# Altium integrated library 兰格封装.IntLib: 1176 symbols (part 1 of 6)
Pins are listed as number, name and electrical type; pins without a type are passive.

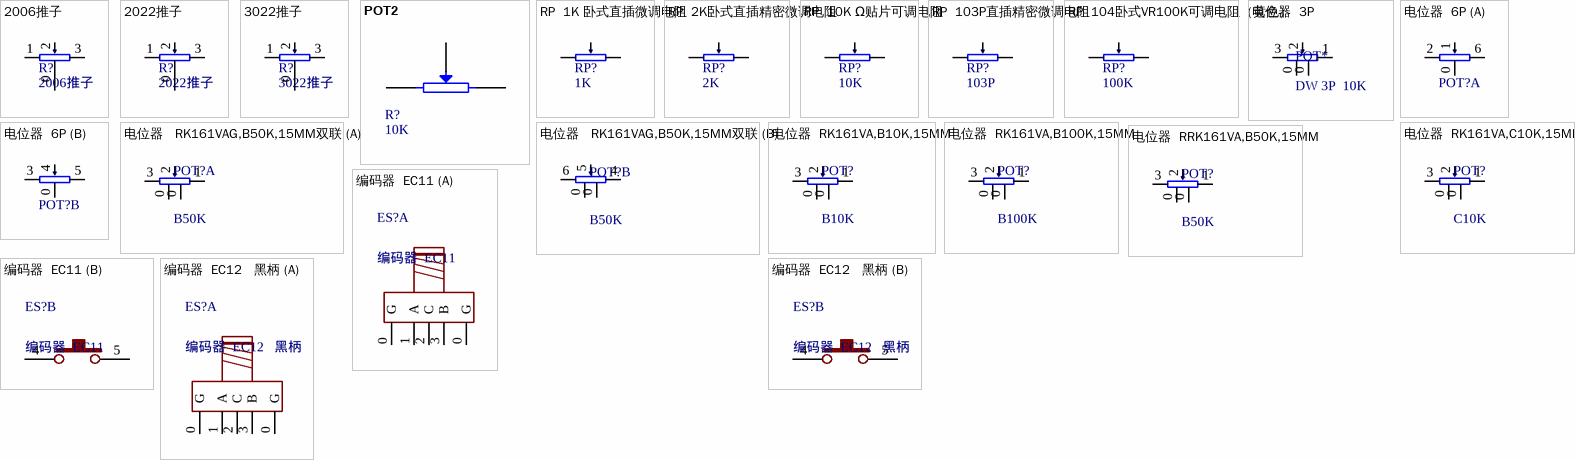
[diagram p0: symbols 2006推子 to 编码器  EC12   黑柄]

## 2006推子
designator R?
SA6005NOA1B-HA1-000推子; 加工方式: 插件; 物料代码: 3.02.06.03.0007; 助记码: SA6005NOA1B-HA1-000T; 单位: ֻ; 备注: MD-2006用; 仓库名称: 五金仓; 物料名称: SA6005NOA1B-HA1-000推子; 规格型号: *
footprint POT  70-60-9-3 (2006推子 脚距70，行程60，宽9，脚数3)
pins: 0, 1, 2, 3

## 2022推子
designator R?
加工方式: 插件; 物料名称: *; 物料代码: *; 助记码: *; 规格型号: *; 单位: *; 仓库名称: *; 备注: *
footprint POT  122-100-10-3 (2022 推子  脚距122，行程100，宽10，脚数3)
pins: 0, 1, 2, 3

## 3022推子
designator R?
加工方式: 插件; 物料名称: *; 物料代码: *; 助记码: *; 规格型号: *; 单位: *; 备注: *; 仓库名称: *
footprint 127-100-16-3 (3022 推子    脚距127，行程100，宽16，脚数3)
footprint POT  127-100-16-3 (3022 推子    脚距127，行程100，宽16，脚数3)
pins: 0, 1, 2, 3

## POT2
designator R?, comment 10K
单位: ֻ; 加工方式: 插件; 物料代码: *; 物料名称: *; 助记码: *; 规格型号: *; 仓库名称: *; 备注: *
footprint 精密电位器
pins: 1, 2, 3 W

## RP  1K 卧式直插微调电阻
designator RP?, comment 1K
1K 卧式直插微调电阻; 物料代码: 3.01.03.02.05.0007; 仓库名称: 元件仓; 助记码: 1K WSZCWDDZ; 单位: ֻ; 加工方式: 插件; 物料名称: 1K 卧式直插微调电阻; 规格型号: *; 备注: *
footprint RP2  1K (1K卧式直插微调电阻)
pins: 1 In, 2 可调, 3 Out

## RP  2K卧式直插精密微调电阻
designator RP?, comment 2K
2K卧式直插精密微调电阻; 物料代码: 3.01.03.02.05.0003; 仓库名称: 元件仓; 助记码: 2KWSZCJMWDDZ; 单位: ֻ; 加工方式: 插件; 物料名称: 2K卧式直插精密微调电阻; 规格型号: *; 备注: *
footprint RP2  2K (2K卧式直插微调电阻)
pins: 1 In, 2 可调, 3 Out

## RP  10K Ω贴片可调电阻
designator RP?, comment 10K
10K Ω贴片可调电阻; 物料代码: 3.01.03.01.04.0001; 仓库名称: 元件仓; 助记码: 10K ΩTPKDDZ; 规格型号: 3*3MM; 单位: ֻ; 加工方式: 贴片; 物料名称: 10K Ω贴片可调电阻; 备注: *
footprint SOT  23
footprint TR 3*3
pins: 1 In, 2 可调, 3 Out

## RP  103P直插精密微调电阻
designator RP?, comment 103P
103P直插精密微调电阻; 物料代码: 3.01.03.02.05.0001; 仓库名称: 元件仓; 助记码: 103PZCJMWDDZ; 单位: ֻ; 加工方式: 插件; 物料名称: 103P直插精密微调电阻; 规格型号: *; 备注: *
pins: 1 In, 2 可调, 3 Out

## RP  104卧式VR100K可调电阻（黄色）
designator RP?, comment 100K
104卧式VR100K可调电阻（黄色）; 物料代码: 3.01.03.02.05.0002; 仓库名称: 元件仓; 单位: ֻ; 加工方式: 插件; 物料名称: 104卧式VR100K可调电阻（黄色）; 助记码: *; 规格型号: *; 备注: *
footprint RP2  100K (100K卧式直插微调电阻)
pins: 1 In, 2 可调, 3 Out

## 电位器  3P
designator POT*, comment DW 3P  10K
RV0932N-F20-C10K电位器; 加工方式: 插件; 物料代码: 3.02.06.02.0007; 助记码: RV0932N-F20-C10KDWQ; 仓库名称: 五金仓; 单位: ֻ; 备注: MD-2006用; 规格型号: 玻纤板亮锡; 物料名称: RV0932N-F20-C10K电位器
footprint POT  10*11.5*23.5 (电位器)
pins: 0, 0, 1, 2, 3

## 电位器  6P
designator POT?, comment DW  6P  50K  (value not drawn)
11KGH-5 B50K L20F*7电位器; 加工方式: 插件; 物料代码: 3.02.06.02.0006; 助记码: 11KGH-5 B50K L20F*7D; 规格型号: 六脚; 单位: ֻ; 备注: MD-2006用; 仓库名称: 五金仓; 物料名称: 11KGH-5 B50K L20F*7电位器
footprint POT  13*16*22.5 G (电位器  2006用)
part A pins: 0, 1, 2, 6
part B pins: 0, 3, 4, 5

## 电位器   RK161VAG,B50K,15MM双联
designator POT?, comment B50K
RK161VAG,B50K,15MM双联电位器; 单位: ֻ; 物料代码: 3.02.06.01.0015; 助记码: RK161VAG,B50K,15MMSLDWQ; 仓库名称: 五金仓·; 物料名称: RK161VAG,B50K,15MM双联电位器
footprint RK161VAG B50K 15MM 双联电位器 (POT RK161VAG B50K 15MM 双联电位器)
part A pins: 0, 0, 1, 2, 3
part B pins: 0, 0, 4, 5, 6

## 电位器  RK161VA,B10K,15MM
designator POT?, comment B10K
RK161VA,B10K,15MM电位器; 单位: ֻ; 物料代码: 3.02.06.01.0010; 仓库名称: 五金仓; 加工方式: 插件; 物料名称: RK161VA,B10K,15MM电位器
footprint RK161VA B10K 15MM (POT RK161VA B10K 15MM)
pins: 0, 0, 1, 2, 3

## 电位器  RK161VA,B100K,15MM
designator POT?, comment B100K
RK161VA,B100K,15MM电位器; 单位: ֻ; 物料代码: 3.02.06.01.0012; 仓库名称: 五金仓; 加工方式: 插件; 物料名称: RK161VA,B100K,15MM电位器
footprint RK161VA B100K 15MM (POT RK161VA B100K 15MM)
pins: 0, 0, 1, 2, 3

## 电位器  RK161VA,C10K,15MM 
designator POT?, comment C10K
RK161VA,C10K,15MM 电位器; 单位: ֻ; 物料代码: 3.02.06.01.0013; 仓库名称: 五金仓; 加工方式: 插件; 物料名称: RK161VA,C10K,15MM 电位器
footprint RK161VA B10K 15MM (POT RK161VA B10K 15MM)
pins: 0, 0, 1, 2, 3

## 电位器  RRK161VA,B50K,15MM
designator POT?, comment B50K
RK161VA,B50K,15MM电位器; 单位: ֻ; 物料代码: 3.02.06.01.0011; 助记码: RK161VA,B50K,15MMDWQ; 仓库名称: 五金仓; 加工方式: 插件; 物料名称: RK161VA,B50K,15MM电位器
footprint RK161VA B50K 15MM (POT RK161VA B50K 15MM)
pins: 0, 0, 1, 2, 3

## 编码器  EC11
designator ES?
EC1102NS-G5-Y15/7-20P2-004编码器; 加工方式: 插件; 物料代码: 3.02.07.05.0005; 单位: ֻ; 备注: K-5200/5210/MD-2006用; 仓库名称: 五金仓; 物料名称: EC1102NS-G5-Y15/7-20P2-004编码器; 助记码: EC1102NS-G5-Y15/7-20; 规格型号: *
footprint EC11
part A pins: 0 G, 0 G, 1 A, 2 C, 3 B
part B pins: 4 SW, 5 SW

## 编码器  EC12   黑柄
designator ES?
EC1202S-D4-F25/7-24P24C编码器; 加工方式: 插件; 物料代码: 3.02.07.05.0006; 规格型号: 黑色塑柄; 单位: ֻ; 备注: T-1500/A-808用; 仓库名称: 五金仓; 物料名称: EC1202S-D4-F25/7-24P24C编码器; 助记码: EC1202S-D4-F25/7-24P
footprint EC12 (黑柄)
part A pins: 0 G, 0 G, 1 A, 2 C, 3 B
part B pins: 4 SW, 5 SW


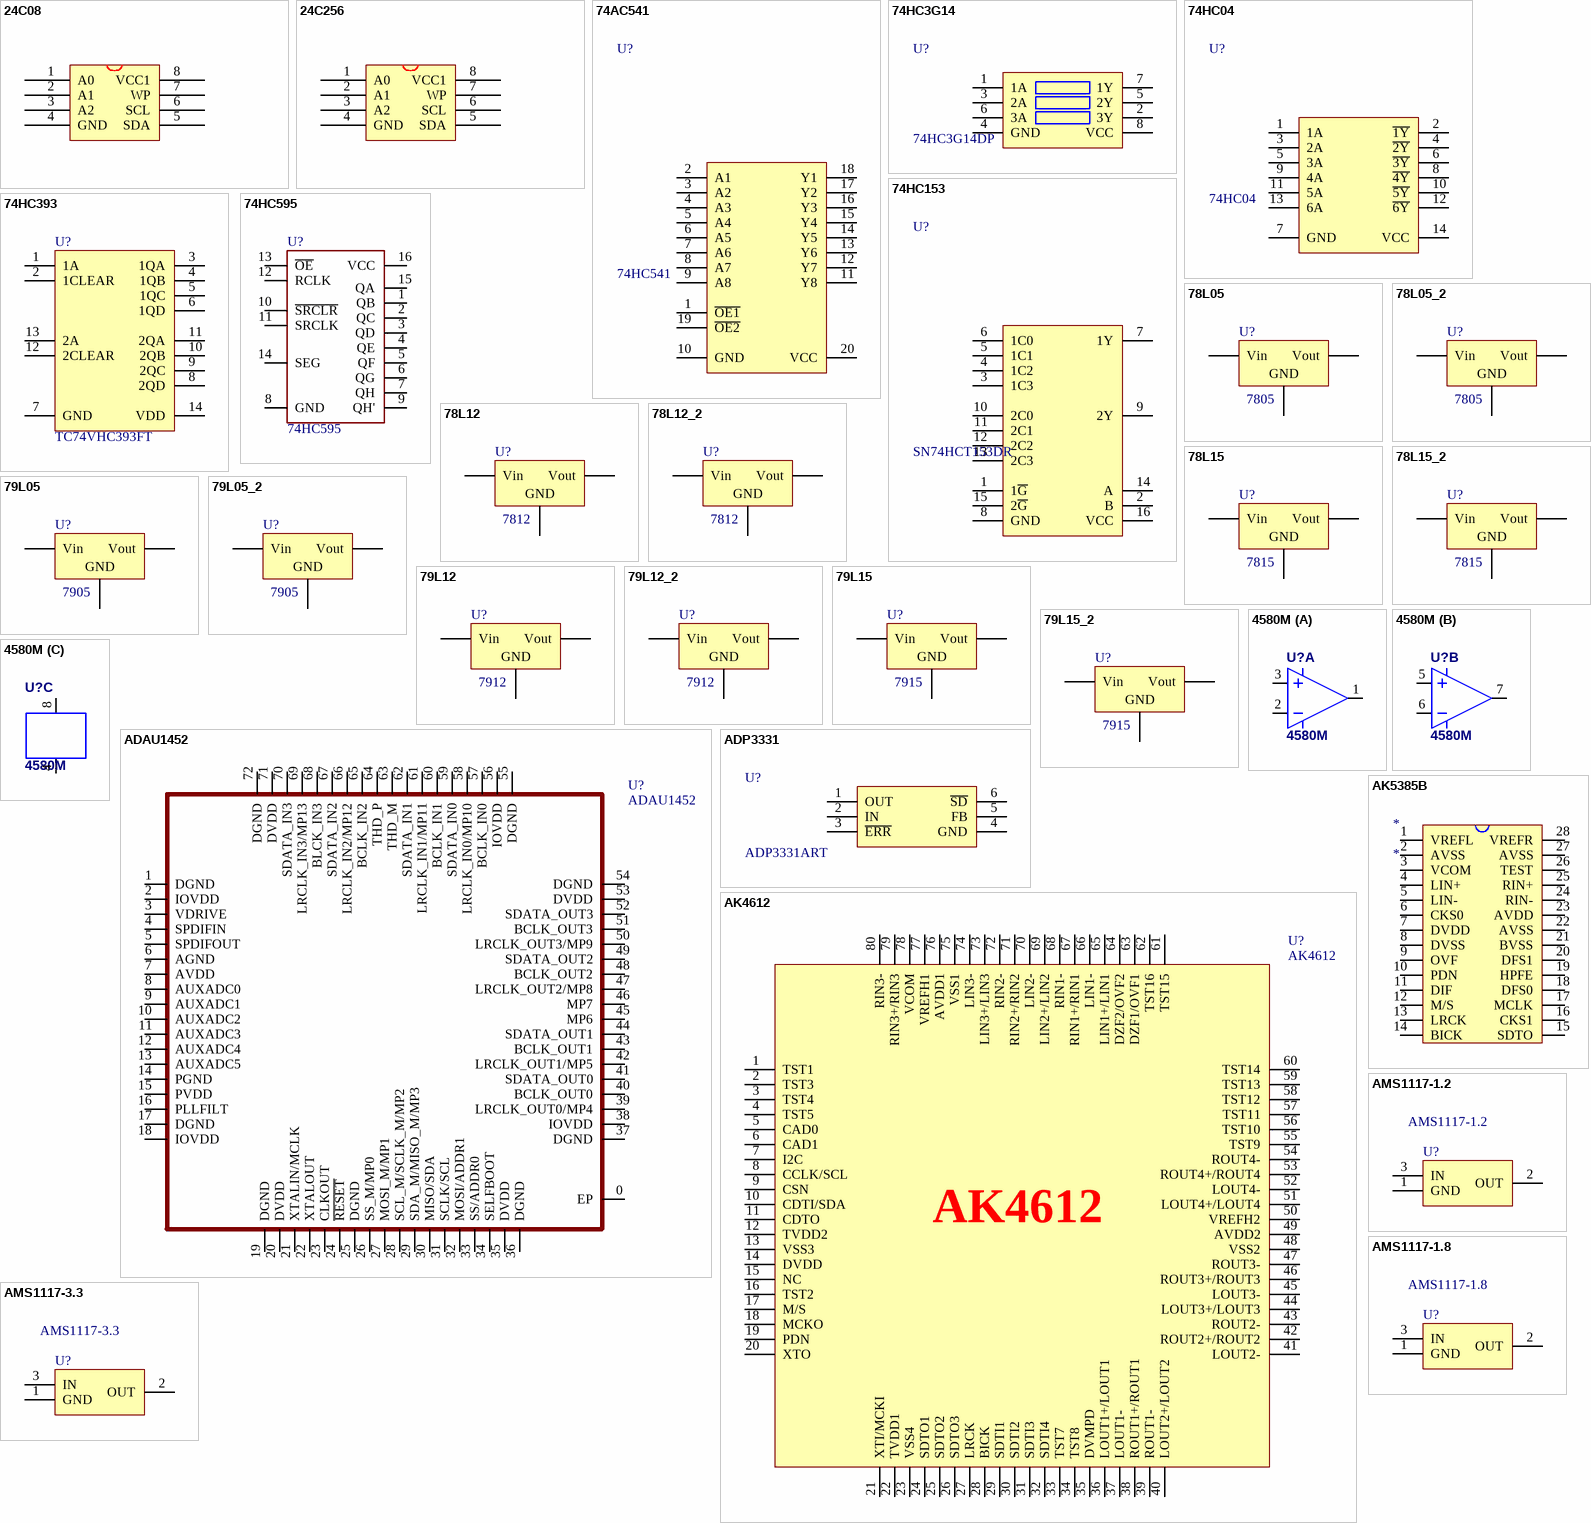
[diagram p1: symbols 24C08 to AMS1117-3.3]

## 24C08
designator U?
HK24C08贴片IC; 物料代码: 3.01.04.02.0079; 助记码: HK24C08TPIC; 规格型号: SOP8; 仓库名称: 元件仓; 单位: ֻ; 加工方式: 贴片; 物料名称: HK24C08贴片IC; 备注: *
footprint SOP 8
pins: 1 A0, 2 A1, 3 A2, 4 GND, 5 SDA, 6 SCL, 7 WP, 8 VCC1

## 24C256
designator U?, comment 24C04
仓库名称: 元件仓; 单位: ֻ; 加工方式: 贴片; 物料代码: *; 物料名称: *; 助记码: *; 规格型号: *; 备注: *
footprint SOP 8
pins: 1 A0, 2 A1, 3 A2, 4 GND, 5 SDA, 6 SCL, 7 WP, 8 VCC1
1 alternate drawing of the same symbol

## 74AC541
designator U?, comment 74HC541
74HC541D贴片IC; 物料代码: 3.01.04.02.0051; 助记码: 74HC541DTPIC; 规格型号: SOP-20; 单位: ֻ; 仓库名称: 元件仓; 物料名称: 74HC541D贴片IC; 加工方式: *
footprint TSSOP 20
pins: 1 ~{OE1} (power), 2 A1, 3 A2, 4 A3, 5 A4, 6 A5, 7 A6, 8 A7, 9 A8, 10 GND, 11 Y8, 12 Y7, 13 Y6, 14 Y5, 15 Y4, 16 Y3, 17 Y2, 18 Y1, 19 ~{OE2} (power), 20 VCC

## 74HC3G14
designator U?, comment 74HC3G14DP
74HC3G14DP 贴片IC; 物料代码: 3.01.04.02.0024; 助记码: 74HC3G14DP TPIC; 规格型号: TSSOP-8; 仓库名称: 元件仓; 单位: ֻ; 物料名称: 74HC3G14DP 贴片IC; 备注: *; 加工方式: *
footprint TSSOP 8
pins: 1 1A, 2 3Y, 3 2A, 4 GND, 5 2Y, 6 3A, 7 1Y (hiz), 8 VCC

## 74HC04
designator U?
74HC04D 贴片IC; 物料代码: 3.01.04.02.0020; 规格型号: SOP-14; 助记码: 74HC04D TPIC; 单位: ֻ; 仓库名称: 元件仓; 物料名称: 74HC04D 贴片IC; 备注: *; 加工方式: *
footprint SOP 14
pins: 1 1A, 2 ~{1Y}, 3 2A, 4 ~{2Y}, 5 3A, 6 ~{3Y}, 7 GND, 8 ~{4Y}, 9 4A, 10 ~{5Y}, 11 5A, 12 ~{6Y}, 13 6A, 14 VCC
2 alternate drawings of the same symbol

## 74HC153
designator U?, comment SN74HCT153DR
74HC153D 贴片IC; 物料代码: 3.01.04.02.0021; 助记码: 74HC153D TPIC; 规格型号: SOP-16; 单位: ֻ; 仓库名称: 元件仓; 物料名称: 74HC153D 贴片IC; 加工方式: *
footprint SOP 16
pins: 1 1~{G}, 2 B, 3 1C3, 4 1C2, 5 1C1, 6 1C0, 7 1Y, 8 GND, 9 2Y, 10 2C0, 11 2C1, 12 2C2, 13 2C3, 14 A, 15 2~{G}, 16 VCC

## 74HC393
designator U?, comment TC74VHC393FT
TC74VHC393FT 贴片IC; 加工方式: 贴片; 物料代码: 3.01.04.02.0023; 助记码: TSSOP-14; 规格型号: TC74VHC393FT TPIC; 单位: ֻ; 仓库名称: 元件仓; 物料名称: TC74VHC393FT 贴片IC; 备注: *
footprint TSSOP 14
pins: 1 1A, 2 1CLEAR, 3 1QA, 4 1QB, 5 1QC, 6 1QD, 7 GND (power), 8 2QD, 9 2QC, 10 2QB, 11 2QA, 12 2CLEAR, 13 2A, 14 VDD (power)

## 74HC595
designator U?
单位: ֻ; 仓库名称: 元件仓; 加工方式: 贴片; 物料代码: *; 物料名称: *; 助记码: *; 规格型号: *; 备注: *
footprint SOP 16
pins: 1 QB, 2 QC, 3 QD, 4 QE, 5 QF, 6 QG, 7 QH, 8 GND, 9 QH', 10 ~{SRCLR}, 11 SRCLK, 12 RCLK, 13 ~{OE}, 14 SEG, 15 QA, 16 VCC

## 78L05
designator U?, comment 7805
L7805直插稳压管; 物料代码: 3.01.16.01.0006; 助记码: L7805ZCWYG; 仓库名称: 元件仓; 单位: 个; 规格型号: TO-220; 加工方式: 插件; 物料名称: L7805直插稳压管
footprint TO 220
pins: 1 Vin, 2 GND, 3 Vout

## 78L05_2
designator U?, comment 7805
L7805直插稳压管（带散热架）; 物料代码: 3.01.16.01.0006; 助记码: L7805ZCWYG; 仓库名称: 元件仓; 单位: 个; 规格型号: TO-220; 备注: （带散热架）; 加工方式: 插件; 物料名称: L7805直插稳压管
footprint TO 220_2 (带散热架)
pins: 1 Vin, 2 GND, 3 Vout

## 78L12
designator U?, comment 7812
L7812CV直插稳压管; 物料代码: 3.01.16.01.0005; 仓库名称: 元件仓; 单位: ֻ; 规格型号: TO-220; 加工方式: 插件; 物料名称: L7812CV直插稳压管; 助记码: *; 备注: *
footprint TO 220
pins: 1 Vin, 2 GND, 3 Vout

## 78L12_2
designator U?, comment 7812
L7812CV直插稳压管（带散热架）; 物料代码: 3.01.16.01.0005; 仓库名称: 元件仓; 单位: ֻ; 规格型号: TO-220; 备注: （带散热架）; 加工方式: 插件; 物料名称: L7812CV直插稳压管; 助记码: *
footprint TO 220
pins: 1 Vin, 2 GND, 3 Vout

## 78L15
designator U?, comment 7815
KA7815直插稳压管; 物料代码: 3.01.16.01.0001; 助记码: KA7815ZCWYG; 仓库名称: 元件仓; 单位: ֻ; 规格型号: TO-220; 加工方式: 插件; 物料名称: KA7815直插稳压管; 备注: *
footprint TO 220
pins: 1 Vin, 2 GND, 3 Vout

## 78L15_2
designator U?, comment 7815
KA7815直插稳压管（带散热架）; 物料代码: 3.01.16.01.0001; 助记码: KA7815ZCWYG; 仓库名称: 元件仓; 单位: ֻ; 规格型号: TO-220; 备注: （带散热架）; 加工方式: 插件; 物料名称: KA7815直插稳压管
footprint TO 220
pins: 1 Vin, 2 GND, 3 Vout

## 79L05
designator U?, comment 7905
L7905CV直插稳压管; 物料代码: 3.01.16.01.0002; 仓库名称: 元件仓; 单位: ֻ; 规格型号: TO-220; 加工方式: 插件; 物料名称: L7905CV直插稳压管
footprint TO 220
pins: 1 GND, 2 Vin, 3 Vout

## 79L05_2
designator U?, comment 7905
L7905CV直插稳压管（带散热架）; 物料代码: 3.01.16.01.0002; 仓库名称: 元件仓; 单位: ֻ; 规格型号: TO-220; 备注: （带散热架）; 加工方式: 插件; 物料名称: L7905CV直插稳压管
footprint TO 220
pins: 1 GND, 2 Vin, 3 Vout

## 79L12
designator U?, comment 7912
L7912CV直插稳压管; 物料代码: 3.01.16.01.0004; 仓库名称: 元件仓; 单位: ֻ; 规格型号: TO-220; 加工方式: 插件; 物料名称: L7912CV直插稳压管; 助记码: *; 备注: *
footprint TO 220
pins: 1 GND, 2 Vin, 3 Vout

## 79L12_2
designator U?, comment 7912
L7912CV直插稳压管（带散热架）; 物料代码: 3.01.16.01.0004; 仓库名称: 元件仓; 单位: ֻ; 规格型号: TO-220; 备注: （带散热架）; 加工方式: 插件; 物料名称: L7912CV直插稳压管; 助记码: *
footprint TO 220
pins: 1 GND, 2 Vin, 3 Vout

## 79L15
designator U?, comment 7915
KA7915直插稳压管; 物料代码: 3.01.16.01.0009; 助记码: KA7915ZCWYG; 仓库名称: 元件仓; 单位: ֻ; 规格型号: TO-220; 加工方式: 插件; 物料名称: KA7915直插稳压管; 备注: *
footprint TO 220
pins: 1 GND, 2 Vin, 3 Vout

## 79L15_2
designator U?, comment 7915
KA7915直插稳压管（带散热架）; 物料代码: 3.01.16.01.0009; 助记码: KA7915ZCWYG; 仓库名称: 元件仓; 单位: ֻ; 规格型号: TO-220; 备注: （带散热架）; 加工方式: 插件; 物料名称: KA7915直插稳压管
footprint TO 220
pins: 1 GND, 2 Vin, 3 Vout

## 4580M
designator U?
SRT4580SM TRPBF贴片IC 运算放大器; 物料代码: 3.01.04.02.0065; 助记码: SRT4580SM TRPBFTPIC; 规格型号: SOP8; 仓库名称: 元件仓; 单位: ֻ; 加工方式: 贴片; 物料名称: SRT4580SM TRPBF贴片IC 运算放大器; 备注: *
footprint SOP 8
part A pins: 1, 2, 3
part B pins: 5, 6, 7
part C pins: 4, 8

## ADAU1452
designator U?
物料名称: *; 加工方式: *; 物料代码: *; 助记码: *; 规格型号: *; 单位: *; 备注: *; 仓库名称: *
footprint LFCSP 72 - duplicate
pins: 0 EP, 1 DGND, 2 IOVDD, 3 VDRIVE, 4 SPDIFIN, 5 SPDIFOUT, 6 AGND, 7 AVDD, 8 AUXADC0, 9 AUXADC1, 10 AUXADC2, 11 AUXADC3, 12 AUXADC4, 13 AUXADC5, 14 PGND, 15 PVDD, 16 PLLFILT, 17 DGND, 18 IOVDD, 19 DGND, 20 DVDD, 21 XTALIN/MCLK, 22 XTALOUT, 23 CLKOUT, 24 ~{RESET}, 25 DGND, 26 SS_M/MP0, 27 MOSI_M/MP1, 28 SCL_M/SCLK_M/MP2, 29 SDA_M/MISO_M/MP3, 30 MISO/SDA, 31 SCLK/SCL, 32 MOSI/ADDR1, 33 SS/ADDR0, 34 SELFBOOT, 35 DVDD, 36 DGND, 37 DGND, 38 IOVDD, 39 LRCLK_OUT0/MP4, 40 BCLK_OUT0, 41 SDATA_OUT0, 42 LRCLK_OUT1/MP5, 43 BCLK_OUT1, 44 SDATA_OUT1, 45 MP6, 46 MP7, 47 LRCLK_OUT2/MP8, 48 BCLK_OUT2, 49 SDATA_OUT2, 50 LRCLK_OUT3/MP9, 51 BCLK_OUT3, 52 SDATA_OUT3, 53 DVDD, 54 DGND, 55 DGND, 56 IOVDD, 57 BCLK_IN0, 58 LRCLK_IN0/MP10, 59 SDATA_IN0, 60 BCLK_IN1, 61 LRCLK_IN1/MP11, 62 SDATA_IN1, 63 THD_M, 64 THD_P, 65 BCLK_IN2, 66 LRCLK_IN2/MP12, 67 SDATA_IN2, 68 BLCK_IN3, 69 LRCLK_IN3/MP13, 70 SDATA_IN3, 71 DVDD, 72 DGND

## ADP3331
designator U?, comment ADP3331ART
高精度、超低静态电流LDO; 仓库名称: 元件仓; 单位: ֻ; 加工方式: 贴片; 物料代码: *; 物料名称: *; 助记码: *; 规格型号: *; 备注: *
footprint SOT 23-6
pins: 1 OUT, 2 IN, 3 ~{ERR}, 4 GND, 5 FB, 6 ~{SD}

## AK4612
designator U?
AK4612-EQ贴片IC; 物料代码: 3.01.04.02.0063; 规格型号: LQFP80; 助记码: AK4612-EQTPIC; 单位: ֻ; 仓库名称: 元件仓; 加工方式: 贴片; 物料名称: AK4612-EQ贴片IC
footprint LQFP  80
pins: 1 TST1, 2 TST3, 3 TST4, 4 TST5, 5 CAD0, 6 CAD1, 7 I2C, 8 CCLK/SCL, 9 CSN, 10 CDTI/SDA, 11 CDTO, 12 TVDD2, 13 VSS3, 14 DVDD, 15 NC, 16 TST2, 17 M/S, 18 MCKO, 19 PDN, 20 XTO, 21 XTI/MCKI, 22 TVDD1, 23 VSS4, 24 SDTO1, 25 SDTO2, 26 SDTO3, 27 LRCK, 28 BICK, 29 SDTI1, 30 SDTI2, 31 SDTI3, 32 SDTI4, 33 TST7, 34 TST8, 35 DVMPD, 36 LOUT1+/LOUT1, 37 LOUT1-, 38 ROUT1+/ROUT1, 39 ROUT1-, 40 LOUT2+/LOUT2, 41 LOUT2-, 42 ROUT2+/ROUT2, 43 ROUT2-, 44 LOUT3+/LOUT3, 45 LOUT3-, 46 ROUT3+/ROUT3, 47 ROUT3-, 48 VSS2, 49 AVDD2, 50 VREFH2, 51 LOUT4+/LOUT4, 52 LOUT4-, 53 ROUT4+/ROUT4, 54 ROUT4-, 55 TST9, 56 TST10, 57 TST11, 58 TST12, 59 TST13, 60 TST14, 61 TST15, 62 TST16, 63 DZF1/OVF1, 64 DZF2/OVF2, 65 LIN1+/LIN1, 66 LIN1-, 67 RIN1+/RIN1, 68 RIN1-, 69 LIN2+/LIN2, 70 LIN2-, 71 RIN2+/RIN2, 72 RIN2-, 73 LIN3+/LIN3, 74 LIN3-, 75 VSS1, 76 AVDD1, 77 VREFH1, 78 VCOM, 79 RIN3+/RIN3, 80 RIN3-

## AK5385B
designator *
物料名称: *; 助记码: *; 规格型号: *; 仓库名称: *; 单位: *; 备注: *; 加工方式: *
footprint VSOP 28
pins: 1 VREFL, 2 AVSS, 3 VCOM, 4 LIN+, 5 LIN-, 6 CKS0, 7 DVDD, 8 DVSS, 9 OVF, 10 PDN, 11 DIF, 12 M/S, 13 LRCK, 14 BICK, 15 SDTO, 16 CKS1, 17 MCLK, 18 DFS0, 19 HPFE, 20 DFS1, 21 BVSS, 22 AVSS, 23 AVDD, 24 RIN-, 25 RIN+, 26 TEST, 27 AVSS, 28 VREFR

## AMS1117-1.2
designator U?
AMS1117-3.3 贴片稳压IC; 物料名称: AMS1117-1.2 贴片稳压IC; 仓库名称: 元件仓; 规格型号: ASM1117-1.2   1551TP; 单位: ֻ; 加工方式: 贴片; 备注: *
footprint SOT-223-4PIN (电源降压  5V降至3.3V)
pins: 1 GND, 2 OUT, 3 IN

## AMS1117-1.8
designator U?
AMS1117-1.8 贴片稳压IC; 仓库名称: 元件仓; 规格型号: ASM1117-1.8   1551TP; 单位: ֻ; 加工方式: 贴片; 物料名称: AMS1117-1.8 贴片稳压IC; 备注: *
footprint SOT-223-4PIN (电源降压  5V降至3.3V)
pins: 1 GND, 2 OUT, 3 IN

## AMS1117-3.3
designator U?
AMS1117-3.3 贴片稳压IC; 物料代码: 3.01.04.02.0004; 仓库名称: 元件仓; 助记码: SOT-223; 规格型号: ASM1117-3.3   1551TP; 单位: ֻ; 加工方式: 贴片; 物料名称: AMS1117-3.3 贴片稳压IC; 备注: *
footprint SOT 223
pins: 1 GND, 2 OUT, 3 IN

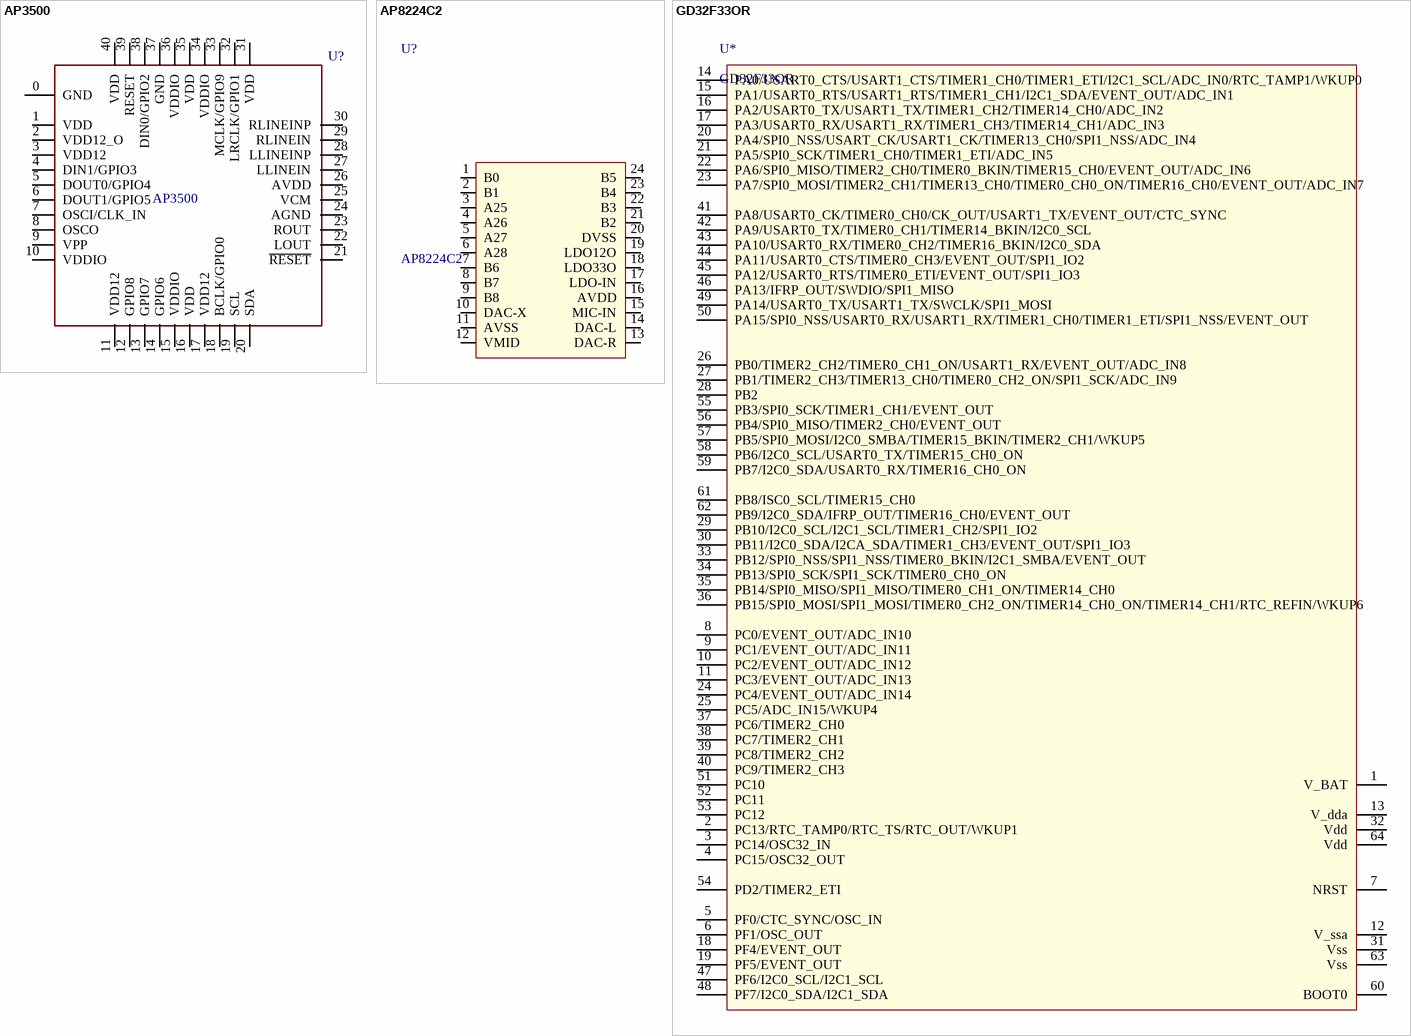
[diagram p2: symbols AP3500 to GD32F33OR]

## AP3500
designator U?
仓库名称: 元件仓; 单位: ֻ; 加工方式: 贴片; 物料代码: *; 物料名称: *; 助记码: *; 规格型号: *; 备注: *
footprint QFN40 (AP3500   5*5MM)
pins: 0 GND, 1 VDD, 2 VDD12_O, 3 VDD12, 4 DIN1/GPIO3, 5 DOUT0/GPIO4, 6 DOUT1/GPIO5, 7 OSCI/CLK_IN, 8 OSCO, 9 VPP, 10 VDDIO, 11 VDD12, 12 GPIO8, 13 GPIO7, 14 GPIO6, 15 VDDIO, 16 VDD, 17 VDD12, 18 BCLK/GPIO0, 19 SCL, 20 SDA, 21 ~{RESET}, 22 LOUT, 23 ROUT, 24 AGND, 25 VCM, 26 AVDD, 27 LLINEIN, 28 LLINEINP, 29 RLINEIN, 30 RLINEINP, 31 VDD, 32 LRCLK/GPIO1, 33 MCLK/GPIO9, 34 VDDIO, 35 VDD, 36 VDDIO, 37 GND, 38 DIN0/GPIO2, 39 RESET, 40 VDD

## AP8224C2
designator U?
（无）AP8224C2; 仓库名称: 元件仓; 单位: ֻ; 加工方式: 贴片; 物料代码: *; 物料名称: *; 助记码: *; 备注: *; 规格型号: *
footprint TSSOP 24
pins: 1 B0, 2 B1, 3 A25, 4 A26, 5 A27, 6 A28, 7 B6, 8 B7, 9 B8, 10 DAC-X, 11 AVSS, 12 VMID, 13 DAC-R, 14 DAC-L, 15 MIC-IN, 16 AVDD, 17 LDO-IN, 18 LDO33O, 19 LDO12O, 20 DVSS, 21 B2, 22 B3, 23 B4, 24 B5

## GD32F33OR
designator U*
LQFP64; 单位: ֻ; 仓库名称: 元件仓; 加工方式: 贴片; 物料名称: GD32F33OR; 物料代码: *; 规格型号: *; 助记码: *; 备注: *
footprint LQFP  64
pins: 1 V_BAT, 2 PC13/RTC_TAMP0/RTC_TS/RTC_OUT/WKUP1, 3 PC14/OSC32_IN, 4 PC15/OSC32_OUT, 5 PF0/CTC_SYNC/OSC_IN, 6 PF1/OSC_OUT, 7 NRST, 8 PC0/EVENT_OUT/ADC_IN10, 9 PC1/EVENT_OUT/ADC_IN11, 10 PC2/EVENT_OUT/ADC_IN12, 11 PC3/EVENT_OUT/ADC_IN13, 12 V_ssa, 13 V_dda, 14 PA0/USART0_CTS/USART1_CTS/TIMER1_CH0/TIMER1_ETI/I2C1_SCL/ADC_IN0/RTC_TAMP1/WKUP0, 15 PA1/USART0_RTS/USART1_RTS/TIMER1_CH1/I2C1_SDA/EVENT_OUT/ADC_IN1, 16 PA2/USART0_TX/USART1_TX/TIMER1_CH2/TIMER14_CH0/ADC_IN2, 17 PA3/USART0_RX/USART1_RX/TIMER1_CH3/TIMER14_CH1/ADC_IN3, 18 PF4/EVENT_OUT, 19 PF5/EVENT_OUT, 20 PA4/SPI0_NSS/USART_CK/USART1_CK/TIMER13_CH0/SPI1_NSS/ADC_IN4, 21 PA5/SPI0_SCK/TIMER1_CH0/TIMER1_ETI/ADC_IN5, 22 PA6/SPI0_MISO/TIMER2_CH0/TIMER0_BKIN/TIMER15_CH0/EVENT_OUT/ADC_IN6, 23 PA7/SPI0_MOSI/TIMER2_CH1/TIMER13_CH0/TIMER0_CH0_ON/TIMER16_CH0/EVENT_OUT/ADC_IN7, 24 PC4/EVENT_OUT/ADC_IN14, 25 PC5/ADC_IN15/WKUP4, 26 PB0/TIMER2_CH2/TIMER0_CH1_ON/USART1_RX/EVENT_OUT/ADC_IN8, 27 PB1/TIMER2_CH3/TIMER13_CH0/TIMER0_CH2_ON/SPI1_SCK/ADC_IN9, 28 PB2, 29 PB10/I2C0_SCL/I2C1_SCL/TIMER1_CH2/SPI1_IO2, 30 PB11/I2C0_SDA/I2CA_SDA/TIMER1_CH3/EVENT_OUT/SPI1_IO3, 31 Vss, 32 Vdd, 33 PB12/SPI0_NSS/SPI1_NSS/TIMER0_BKIN/I2C1_SMBA/EVENT_OUT, 34 PB13/SPI0_SCK/SPI1_SCK/TIMER0_CH0_ON, 35 PB14/SPI0_MISO/SPI1_MISO/TIMER0_CH1_ON/TIMER14_CH0, 36 PB15/SPI0_MOSI/SPI1_MOSI/TIMER0_CH2_ON/TIMER14_CH0_ON/TIMER14_CH1/RTC_REFIN/WKUP6, 37 PC6/TIMER2_CH0, 38 PC7/TIMER2_CH1, 39 PC8/TIMER2_CH2, 40 PC9/TIMER2_CH3, 41 PA8/USART0_CK/TIMER0_CH0/CK_OUT/USART1_TX/EVENT_OUT/CTC_SYNC, 42 PA9/USART0_TX/TIMER0_CH1/TIMER14_BKIN/I2C0_SCL, 43 PA10/USART0_RX/TIMER0_CH2/TIMER16_BKIN/I2C0_SDA, 44 PA11/USART0_CTS/TIMER0_CH3/EVENT_OUT/SPI1_IO2, 45 PA12/USART0_RTS/TIMER0_ETI/EVENT_OUT/SPI1_IO3, 46 PA13/IFRP_OUT/SWDIO/SPI1_MISO, 47 PF6/I2C0_SCL/I2C1_SCL, 48 PF7/I2C0_SDA/I2C1_SDA, 49 PA14/USART0_TX/USART1_TX/SWCLK/SPI1_MOSI, 50 PA15/SPI0_NSS/USART0_RX/USART1_RX/TIMER1_CH0/TIMER1_ETI/SPI1_NSS/EVENT_OUT, 51 PC10, 52 PC11, 53 PC12, 54 PD2/TIMER2_ETI, 55 PB3/SPI0_SCK/TIMER1_CH1/EVENT_OUT, 56 PB4/SPI0_MISO/TIMER2_CH0/EVENT_OUT, 57 PB5/SPI0_MOSI/I2C0_SMBA/TIMER15_BKIN/TIMER2_CH1/WKUP5, 58 PB6/I2C0_SCL/USART0_TX/TIMER15_CH0_ON, 59 PB7/I2C0_SDA/USART0_RX/TIMER16_CH0_ON, 60 BOOT0, 61 PB8/ISC0_SCL/TIMER15_CH0, 62 PB9/I2C0_SDA/IFRP_OUT/TIMER16_CH0/EVENT_OUT, 63 Vss, 64 Vdd

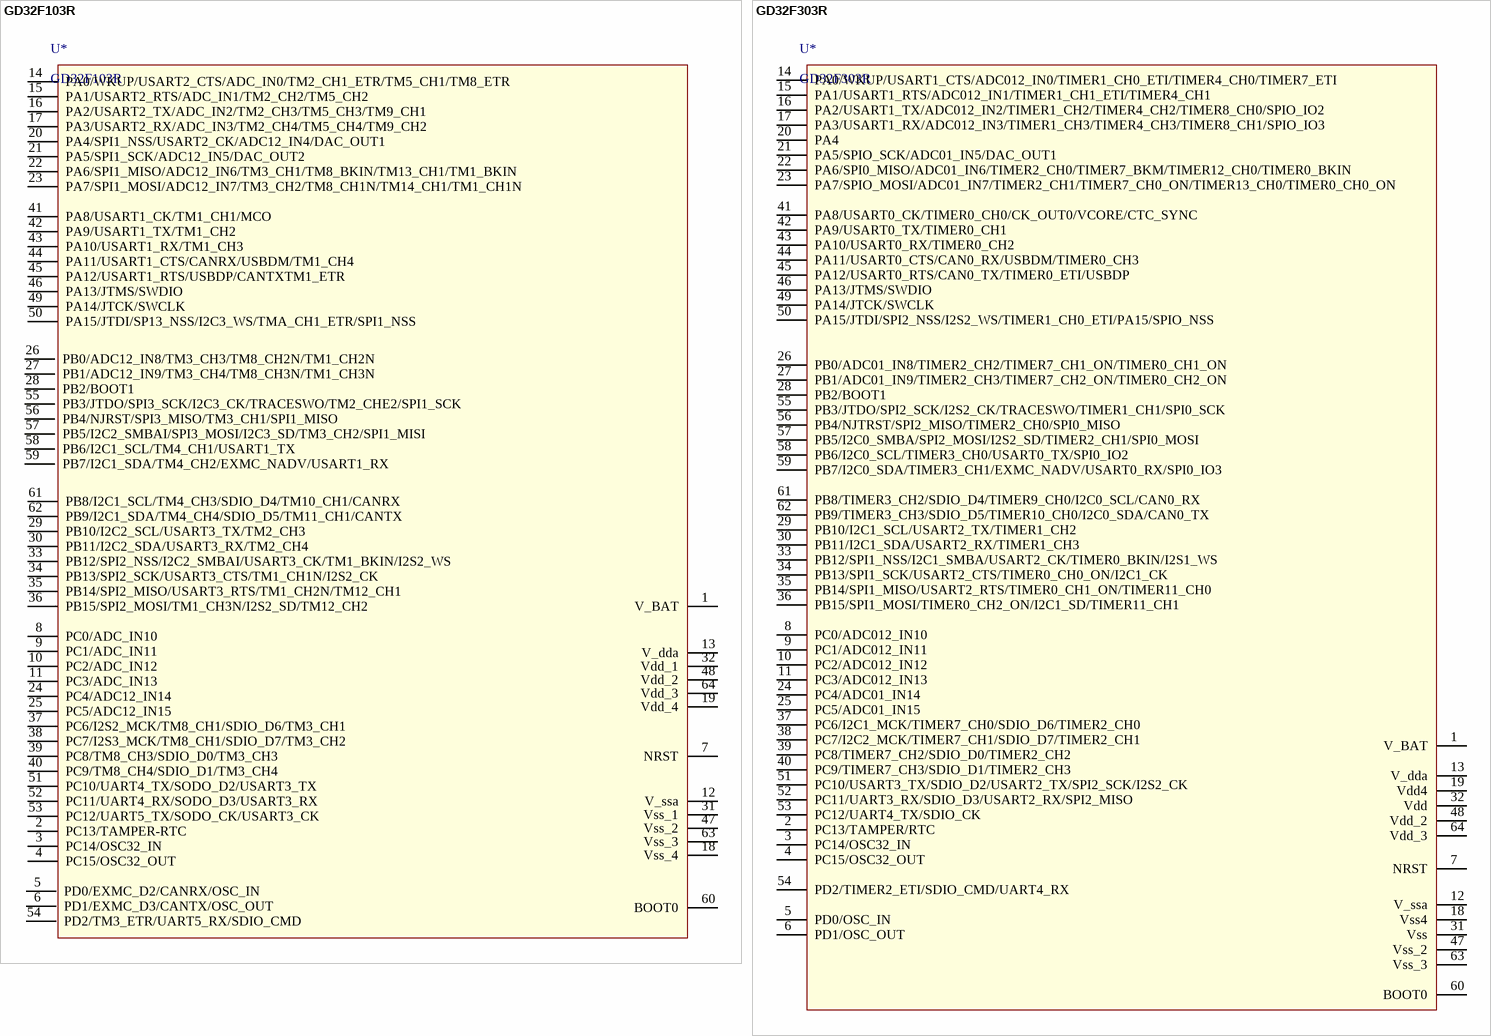
[diagram p3: symbols GD32F103R to GD32F303R]

## GD32F103R
designator U*
LQFP64; 物料名称: GD32F33OR; 单位: ֻ; 仓库名称: 元件仓; 加工方式: 贴片; 物料代码: *; 规格型号: *; 助记码: *; 备注: *
footprint LQFP  64
pins: 1 V_BAT, 2 PC13/TAMPER-RTC, 3 PC14/OSC32_IN, 4 PC15/OSC32_OUT, 5 PD0/EXMC_D2/CANRX/OSC_IN, 6 PD1/EXMC_D3/CANTX/OSC_OUT, 7 NRST, 8 PC0/ADC_IN10, 9 PC1/ADC_IN11, 10 PC2/ADC_IN12, 11 PC3/ADC_IN13, 12 V_ssa, 13 V_dda, 14 PA0/WKUP/USART2_CTS/ADC_IN0/TM2_CH1_ETR/TM5_CH1/TM8_ETR, 15 PA1/USART2_RTS/ADC_IN1/TM2_CH2/TM5_CH2, 16 PA2/USART2_TX/ADC_IN2/TM2_CH3/TM5_CH3/TM9_CH1, 17 PA3/USART2_RX/ADC_IN3/TM2_CH4/TM5_CH4/TM9_CH2, 18 Vss_4, 19 Vdd_4, 20 PA4/SPI1_NSS/USART2_CK/ADC12_IN4/DAC_OUT1, 21 PA5/SPI1_SCK/ADC12_IN5/DAC_OUT2, 22 PA6/SPI1_MISO/ADC12_IN6/TM3_CH1/TM8_BKIN/TM13_CH1/TM1_BKIN, 23 PA7/SPI1_MOSI/ADC12_IN7/TM3_CH2/TM8_CH1N/TM14_CH1/TM1_CH1N, 24 PC4/ADC12_IN14, 25 PC5/ADC12_IN15, 26 PB0/ADC12_IN8/TM3_CH3/TM8_CH2N/TM1_CH2N, 27 PB1/ADC12_IN9/TM3_CH4/TM8_CH3N/TM1_CH3N, 28 PB2/BOOT1, 29 PB10/I2C2_SCL/USART3_TX/TM2_CH3  , 30 PB11/I2C2_SDA/USART3_RX/TM2_CH4  , 31 Vss_1, 32 Vdd_1, 33 PB12/SPI2_NSS/I2C2_SMBAI/USART3_CK/TM1_BKIN/I2S2_WS  , 34 PB13/SPI2_SCK/USART3_CTS/TM1_CH1N/I2S2_CK  , 35 PB14/SPI2_MISO/USART3_RTS/TM1_CH2N/TM12_CH1  , 36 PB15/SPI2_MOSI/TM1_CH3N/I2S2_SD/TM12_CH2  , 37 PC6/I2S2_MCK/TM8_CH1/SDIO_D6/TM3_CH1  , 38 PC7/I2S3_MCK/TM8_CH1/SDIO_D7/TM3_CH2  , 39 PC8/TM8_CH3/SDIO_D0/TM3_CH3  , 40 PC9/TM8_CH4/SDIO_D1/TM3_CH4  , 41 PA8/USART1_CK/TM1_CH1/MCO  , 42 PA9/USART1_TX/TM1_CH2  , 43 PA10/USART1_RX/TM1_CH3  , 44 PA11/USART1_CTS/CANRX/USBDM/TM1_CH4  , 45 PA12/USART1_RTS/USBDP/CANTXTM1_ETR  , 46 PA13/JTMS/SWDIO  , 47 Vss_2, 48 Vdd_2, 49 PA14/JTCK/SWCLK  , 50 PA15/JTDI/SP13_NSS/I2C3_WS/TMA_CH1_ETR/SPI1_NSS  , 51 PC10/UART4_TX/SODO_D2/USART3_TX  , 52 PC11/UART4_RX/SODO_D3/USART3_RX  , 53 PC12/UART5_TX/SODO_CK/USART3_CK  , 54 PD2/TM3_ETR/UART5_RX/SDIO_CMD  , 55 PB3/JTDO/SPI3_SCK/I2C3_CK/TRACESWO/TM2_CHE2/SPI1_SCK  , 56 PB4/NJRST/SPI3_MISO/TM3_CH1/SPI1_MISO  , 57 PB5/I2C2_SMBAI/SPI3_MOSI/I2C3_SD/TM3_CH2/SPI1_MISI  , 58 PB6/I2C1_SCL/TM4_CH1/USART1_TX  , 59 PB7/I2C1_SDA/TM4_CH2/EXMC_NADV/USART1_RX  , 60 BOOT0, 61 PB8/I2C1_SCL/TM4_CH3/SDIO_D4/TM10_CH1/CANRX  , 62 PB9/I2C1_SDA/TM4_CH4/SDIO_D5/TM11_CH1/CANTX  , 63 Vss_3, 64 Vdd_3